# Altium footprint library PCB_CONNECTORS.PcbLib: 676 footprints (part 19 of 43)
Each footprint in its own frame and in the unit in brackets; x right, y up, seen from the top. Pads: shape width x height; smd on the part's side, far side on the other; paste and mask are expansions set on the pad; w line width, h text height; cw(c..) or ccw(c..) is an arc to the next point about the centre after c.
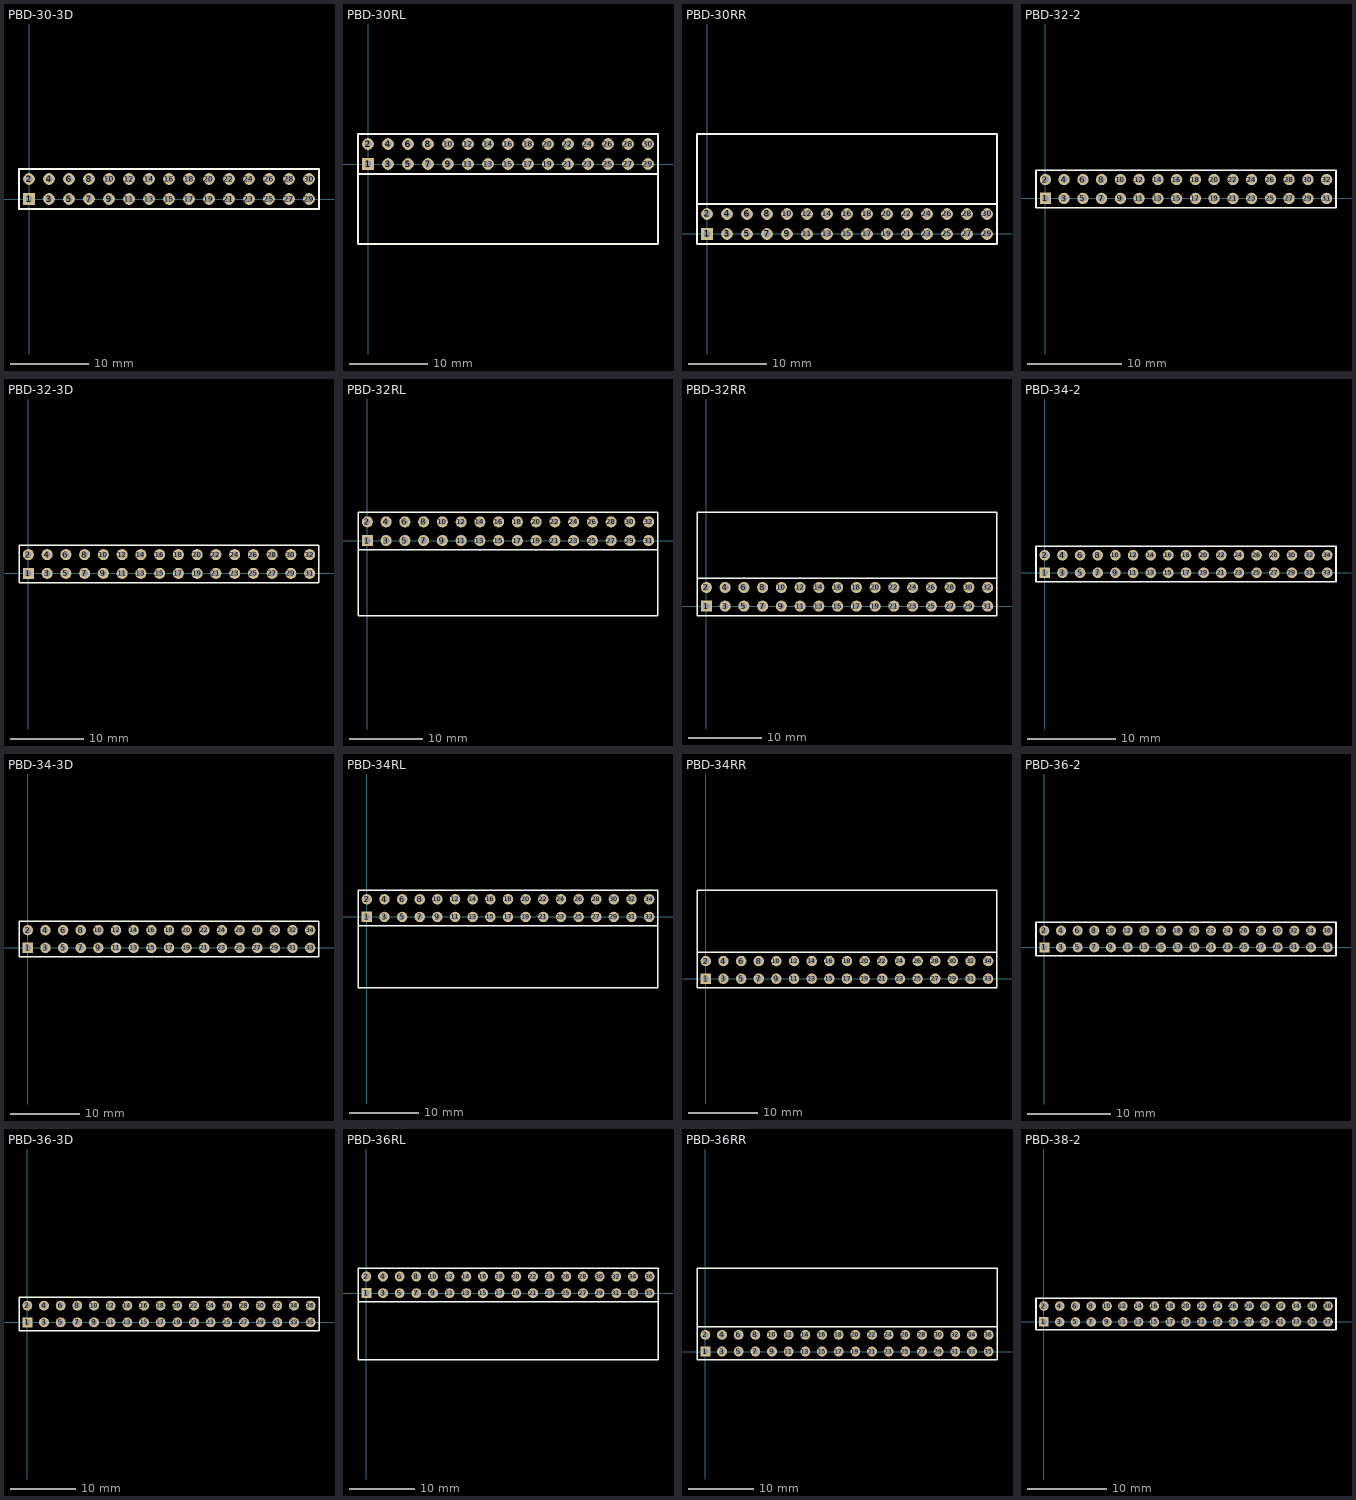
[diagram p18: the footprints below, top view; thin cyan lines are the x and y axes]

## PBD-30-3D [mm] "Connector; Header; 15x2 Position"
height 8
pads (30):
  rect 1.5x1.5 hole 0.9: 1(0,0)
  round 1.5 hole 0.9: 2(0,2.54) 3(2.54,0) 4(2.54,2.54) 5(5.08,0) 6(5.08,2.54) 7(7.62,0) 8(7.62,2.54) 9(10.16,0) 10(10.16,2.54) 11(12.7,0) 12(12.7,2.54) 13(15.24,0) 14(15.24,2.54) 15(17.78,0) 16(17.78,2.54) 17(20.32,0) 18(20.32,2.54) 19(22.86,0) 20(22.86,2.54) 21(25.4,0) 22(25.4,2.54) 23(27.94,0) 24(27.94,2.54) 25(30.48,0) 26(30.48,2.54) 27(33.02,0) 28(33.02,2.54) 29(35.56,0) 30(35.56,2.54)
Top Overlay:
  lines w0.2: -1.27,-1.27 36.83,-1.27 36.83,3.81 -1.27,3.81 -1.27,-1.27
3D body "PBD-2.stp": height 8.5, standoff -3.15, extent 31.75,-1.27 34.29,3.81
3D body "PBD-2.stp": height 8.5, standoff -3.15, extent 29.21,-1.27 31.75,3.81
3D body "PBD-2.stp": height 8.5, standoff -3.15, extent 34.29,-1.27 36.83,3.81
3D body "PBD-2.stp": height 8.5, standoff -3.15, extent 24.13,-1.27 26.67,3.81
3D body "PBD-2.stp": height 8.5, standoff -3.15, extent 21.59,-1.27 24.13,3.81
3D body "PBD-2.stp": height 8.5, standoff -3.15, extent 26.67,-1.27 29.21,3.81
3D body "PBD-2.stp": height 8.5, standoff -3.15, extent 16.51,-1.27 19.05,3.81
3D body "PBD-2.stp": height 8.5, standoff -3.15, extent 13.97,-1.27 16.51,3.81
3D body "PBD-2.stp": height 8.5, standoff -3.15, extent 19.05,-1.27 21.59,3.81
3D body "PBD-2.stp": height 8.5, standoff -3.15, extent 8.89,-1.27 11.43,3.81
3D body "PBD-2.stp": height 8.5, standoff -3.15, extent 6.35,-1.27 8.89,3.81
3D body "PBD-2.stp": height 8.5, standoff -3.15, extent 11.43,-1.27 13.97,3.81
3D body "PBD-2.stp": height 8.5, standoff -3.15, extent 1.27,-1.27 3.81,3.81
3D body "PBD-2.stp": height 8.5, standoff -3.15, extent -1.27,-1.27 1.27,3.81
3D body "PBD-2.stp": height 8.5, standoff -3.15, extent 3.81,-1.27 6.35,3.81

## PBD-30RL [mm] "Connector; Header; 15x2 Position"
height 5
pads (30):
  rect 1.5x1.5 hole 0.9: 1(0,0)
  round 1.5 hole 0.9: 2(0,2.54) 3(2.54,0) 4(2.54,2.54) 5(5.08,0) 6(5.08,2.54) 7(7.62,0) 8(7.62,2.54) 9(10.16,0) 10(10.16,2.54) 11(12.7,0) 12(12.7,2.54) 13(15.24,0) 14(15.24,2.54) 15(17.78,0) 16(17.78,2.54) 17(20.32,0) 18(20.32,2.54) 19(22.86,0) 20(22.86,2.54) 21(25.4,0) 22(25.4,2.54) 23(27.94,0) 24(27.94,2.54) 25(30.48,0) 26(30.48,2.54) 27(33.02,0) 28(33.02,2.54) 29(35.56,0) 30(35.56,2.54)
Top Overlay:
  lines w0.2: -1.27,-1.27 -1.27,-10.16 36.83,-10.16 36.83,-1.27 ; -1.27,-1.27 36.83,-1.27 ; -1.27,-1.27 -1.27,3.81 36.83,3.81 36.83,-1.27
3D body "PBD-30R.step": height 5, standoff -3, extent -1.27,-10.16 36.83,2.84

## PBD-30RR [mm] "Connector; Header; 15x2 Position"
height 5
pads (30):
  rect 1.5x1.5 hole 0.9: 1(0,0)
  round 1.5 hole 0.9: 2(0,2.54) 3(2.54,0) 4(2.54,2.54) 5(5.08,0) 6(5.08,2.54) 7(7.62,0) 8(7.62,2.54) 9(10.16,0) 10(10.16,2.54) 11(12.7,0) 12(12.7,2.54) 13(15.24,0) 14(15.24,2.54) 15(17.78,0) 16(17.78,2.54) 17(20.32,0) 18(20.32,2.54) 19(22.86,0) 20(22.86,2.54) 21(25.4,0) 22(25.4,2.54) 23(27.94,0) 24(27.94,2.54) 25(30.48,0) 26(30.48,2.54) 27(33.02,0) 28(33.02,2.54) 29(35.56,0) 30(35.56,2.54)
Top Overlay:
  lines w0.2: -1.27,3.81 -1.27,12.7 36.83,12.7 36.83,3.81 ; -1.27,3.81 36.83,3.81 ; -1.27,3.81 -1.27,-1.27 36.83,-1.27 36.83,3.81
3D body "PBD-30R.step": height 5, standoff -3, extent -1.27,-0.3 36.83,12.7

## PBD-32-2 [mm] "Connector; Header; 16x2 Position"
height 4.5
pads (32):
  rect 1.2x1.2 hole 0.75: 1(0,0)
  round 1.2 hole 0.75: 2(0,2) 3(2,0) 4(2,2) 5(4,0) 6(4,2) 7(6,0) 8(6,2) 9(8,0) 10(8,2) 11(10,0) 12(10,2) 13(12,0) 14(12,2) 15(14,0) 16(14,2) 17(16,0) 18(16,2) 19(18,0) 20(18,2) 21(20,0) 22(20,2) 23(22,0) 24(22,2) 25(24,0) 26(24,2) 27(26,0) 28(26,2) 29(28,0) 30(28,2) 31(30,0) 32(30,2)
Top Overlay:
  lines w0.2: -1,-1 31,-1 31,3 -1,3 -1,-1
3D body "PBD2mm.stp": height 4.5, standoff -2.7, extent 29,-1 31,3
3D body "PBD2mm.stp": height 4.5, standoff -2.7, extent 27,-1 29,3
3D body "PBD2mm.stp": height 4.5, standoff -2.7, extent 25,-1 27,3
3D body "PBD2mm.stp": height 4.5, standoff -2.7, extent 23,-1 25,3
3D body "PBD2mm.stp": height 4.5, standoff -2.7, extent 21,-1 23,3
3D body "PBD2mm.stp": height 4.5, standoff -2.7, extent 19,-1 21,3
3D body "PBD2mm.stp": height 4.5, standoff -2.7, extent 17,-1 19,3
3D body "PBD2mm.stp": height 4.5, standoff -2.7, extent 15,-1 17,3
3D body "PBD2mm.stp": height 4.5, standoff -2.7, extent 13,-1 15,3
3D body "PBD2mm.stp": height 4.5, standoff -2.7, extent 11,-1 13,3
3D body "PBD2mm.stp": height 4.5, standoff -2.7, extent 9,-1 11,3
3D body "PBD2mm.stp": height 4.5, standoff -2.7, extent 7,-1 9,3
3D body "PBD2mm.stp": height 4.5, standoff -2.7, extent 5,-1 7,3
3D body "PBD2mm.stp": height 4.5, standoff -2.7, extent 3,-1 5,3
3D body "PBD2mm.stp": height 4.5, standoff -2.7, extent 1,-1 3,3
3D body "PBD2mm.stp": height 4.5, standoff -2.7, extent -1,-1 1,3

## PBD-32-3D [mm] "Connector; Header; 16x2 Position"
height 8
pads (32):
  rect 1.5x1.5 hole 0.9: 1(0,0)
  round 1.5 hole 0.9: 2(0,2.54) 3(2.54,0) 4(2.54,2.54) 5(5.08,0) 6(5.08,2.54) 7(7.62,0) 8(7.62,2.54) 9(10.16,0) 10(10.16,2.54) 11(12.7,0) 12(12.7,2.54) 13(15.24,0) 14(15.24,2.54) 15(17.78,0) 16(17.78,2.54) 17(20.32,0) 18(20.32,2.54) 19(22.86,0) 20(22.86,2.54) 21(25.4,0) 22(25.4,2.54) 23(27.94,0) 24(27.94,2.54) 25(30.48,0) 26(30.48,2.54) 27(33.02,0) 28(33.02,2.54) 29(35.56,0) 30(35.56,2.54) 31(38.1,0) 32(38.1,2.54)
Top Overlay:
  lines w0.2: -1.27,-1.27 39.37,-1.27 39.37,3.81 -1.27,3.81 -1.27,-1.27
3D body "PBD-2.stp": height 8.5, standoff -3.15, extent 31.75,-1.27 34.29,3.81
3D body "PBD-2.stp": height 8.5, standoff -3.15, extent 29.21,-1.27 31.75,3.81
3D body "PBD-2.stp": height 8.5, standoff -3.15, extent 34.29,-1.27 36.83,3.81
3D body "PBD-2.stp": height 8.5, standoff -3.15, extent 24.13,-1.27 26.67,3.81
3D body "PBD-2.stp": height 8.5, standoff -3.15, extent 21.59,-1.27 24.13,3.81
3D body "PBD-2.stp": height 8.5, standoff -3.15, extent 26.67,-1.27 29.21,3.81
3D body "PBD-2.stp": height 8.5, standoff -3.15, extent 16.51,-1.27 19.05,3.81
3D body "PBD-2.stp": height 8.5, standoff -3.15, extent 13.97,-1.27 16.51,3.81
3D body "PBD-2.stp": height 8.5, standoff -3.15, extent 19.05,-1.27 21.59,3.81
3D body "PBD-2.stp": height 8.5, standoff -3.15, extent 8.89,-1.27 11.43,3.81
3D body "PBD-2.stp": height 8.5, standoff -3.15, extent 6.35,-1.27 8.89,3.81
3D body "PBD-2.stp": height 8.5, standoff -3.15, extent 11.43,-1.27 13.97,3.81
3D body "PBD-2.stp": height 8.5, standoff -3.15, extent 1.27,-1.27 3.81,3.81
3D body "PBD-2.stp": height 8.5, standoff -3.15, extent -1.27,-1.27 1.27,3.81
3D body "PBD-2.stp": height 8.5, standoff -3.15, extent 3.81,-1.27 6.35,3.81
3D body "PBD-2.stp": height 8.5, standoff -3.15, extent 36.83,-1.27 39.37,3.81

## PBD-32RL [mm] "Connector; Header; 16x2 Position"
height 5
pads (32):
  rect 1.5x1.5 hole 0.9: 1(0,0)
  round 1.5 hole 0.9: 2(0,2.54) 3(2.54,0) 4(2.54,2.54) 5(5.08,0) 6(5.08,2.54) 7(7.62,0) 8(7.62,2.54) 9(10.16,0) 10(10.16,2.54) 11(12.7,0) 12(12.7,2.54) 13(15.24,0) 14(15.24,2.54) 15(17.78,0) 16(17.78,2.54) 17(20.32,0) 18(20.32,2.54) 19(22.86,0) 20(22.86,2.54) 21(25.4,0) 22(25.4,2.54) 23(27.94,0) 24(27.94,2.54) 25(30.48,0) 26(30.48,2.54) 27(33.02,0) 28(33.02,2.54) 29(35.56,0) 30(35.56,2.54) 31(38.1,0) 32(38.1,2.54)
Top Overlay:
  lines w0.2: -1.27,-1.27 -1.27,-10.16 39.37,-10.16 39.37,-1.27 ; -1.27,-1.27 39.37,-1.27 ; -1.27,-1.27 -1.27,3.81 39.37,3.81 39.37,-1.27
3D body "PBD-32R.step": height 5, standoff -3, extent -1.27,-10.16 39.37,2.84

## PBD-32RR [mm] "Connector; Header; 16x2 Position"
height 5
pads (32):
  rect 1.5x1.5 hole 0.9: 1(0,0)
  round 1.5 hole 0.9: 2(0,2.54) 3(2.54,0) 4(2.54,2.54) 5(5.08,0) 6(5.08,2.54) 7(7.62,0) 8(7.62,2.54) 9(10.16,0) 10(10.16,2.54) 11(12.7,0) 12(12.7,2.54) 13(15.24,0) 14(15.24,2.54) 15(17.78,0) 16(17.78,2.54) 17(20.32,0) 18(20.32,2.54) 19(22.86,0) 20(22.86,2.54) 21(25.4,0) 22(25.4,2.54) 23(27.94,0) 24(27.94,2.54) 25(30.48,0) 26(30.48,2.54) 27(33.02,0) 28(33.02,2.54) 29(35.56,0) 30(35.56,2.54) 31(38.1,0) 32(38.1,2.54)
Top Overlay:
  lines w0.2: -1.27,3.81 -1.27,12.7 39.37,12.7 39.37,3.81 ; -1.27,3.81 39.37,3.81 ; -1.27,3.81 -1.27,-1.27 39.37,-1.27 39.37,3.81
3D body "PBD-32R.step": height 5, standoff -3, extent -1.27,-0.3 39.37,12.7

## PBD-34-2 [mm] "Connector; Header; 17x2 Position"
height 4.5
pads (34):
  rect 1.2x1.2 hole 0.75: 1(0,0)
  round 1.2 hole 0.75: 2(0,2) 3(2,0) 4(2,2) 5(4,0) 6(4,2) 7(6,0) 8(6,2) 9(8,0) 10(8,2) 11(10,0) 12(10,2) 13(12,0) 14(12,2) 15(14,0) 16(14,2) 17(16,0) 18(16,2) 19(18,0) 20(18,2) 21(20,0) 22(20,2) 23(22,0) 24(22,2) 25(24,0) 26(24,2) 27(26,0) 28(26,2) 29(28,0) 30(28,2) 31(30,0) 32(30,2) 33(32,0) 34(32,2)
Top Overlay:
  lines w0.2: -1,-1 33,-1 33,3 -1,3 -1,-1
3D body "PBD2mm.stp": height 4.5, standoff -2.7, extent 31,-1 33,3
3D body "PBD2mm.stp": height 4.5, standoff -2.7, extent 29,-1 31,3
3D body "PBD2mm.stp": height 4.5, standoff -2.7, extent 27,-1 29,3
3D body "PBD2mm.stp": height 4.5, standoff -2.7, extent 25,-1 27,3
3D body "PBD2mm.stp": height 4.5, standoff -2.7, extent 23,-1 25,3
3D body "PBD2mm.stp": height 4.5, standoff -2.7, extent 21,-1 23,3
3D body "PBD2mm.stp": height 4.5, standoff -2.7, extent 19,-1 21,3
3D body "PBD2mm.stp": height 4.5, standoff -2.7, extent 17,-1 19,3
3D body "PBD2mm.stp": height 4.5, standoff -2.7, extent 15,-1 17,3
3D body "PBD2mm.stp": height 4.5, standoff -2.7, extent 13,-1 15,3
3D body "PBD2mm.stp": height 4.5, standoff -2.7, extent 11,-1 13,3
3D body "PBD2mm.stp": height 4.5, standoff -2.7, extent 9,-1 11,3
3D body "PBD2mm.stp": height 4.5, standoff -2.7, extent 7,-1 9,3
3D body "PBD2mm.stp": height 4.5, standoff -2.7, extent 5,-1 7,3
3D body "PBD2mm.stp": height 4.5, standoff -2.7, extent 3,-1 5,3
3D body "PBD2mm.stp": height 4.5, standoff -2.7, extent 1,-1 3,3
3D body "PBD2mm.stp": height 4.5, standoff -2.7, extent -1,-1 1,3

## PBD-34-3D [mm] "Connector; Header; 17x2 Position"
height 8
pads (34):
  rect 1.5x1.5 hole 0.9: 1(0,0)
  round 1.5 hole 0.9: 2(0,2.54) 3(2.54,0) 4(2.54,2.54) 5(5.08,0) 6(5.08,2.54) 7(7.62,0) 8(7.62,2.54) 9(10.16,0) 10(10.16,2.54) 11(12.7,0) 12(12.7,2.54) 13(15.24,0) 14(15.24,2.54) 15(17.78,0) 16(17.78,2.54) 17(20.32,0) 18(20.32,2.54) 19(22.86,0) 20(22.86,2.54) 21(25.4,0) 22(25.4,2.54) 23(27.94,0) 24(27.94,2.54) 25(30.48,0) 26(30.48,2.54) 27(33.02,0) 28(33.02,2.54) 29(35.56,0) 30(35.56,2.54) 31(38.1,0) 32(38.1,2.54) 33(40.64,0) 34(40.64,2.54)
Top Overlay:
  lines w0.2: -1.27,-1.27 41.91,-1.27 41.91,3.81 -1.27,3.81 -1.27,-1.27
3D body "PBD-2.stp": height 8.5, standoff -3.15, extent 39.37,-1.27 41.91,3.81
3D body "PBD-2.stp": height 8.5, standoff -3.15, extent 36.83,-1.27 39.37,3.81
3D body "PBD-2.stp": height 8.5, standoff -3.15, extent 3.81,-1.27 6.35,3.81
3D body "PBD-2.stp": height 8.5, standoff -3.15, extent -1.27,-1.27 1.27,3.81
3D body "PBD-2.stp": height 8.5, standoff -3.15, extent 1.27,-1.27 3.81,3.81
3D body "PBD-2.stp": height 8.5, standoff -3.15, extent 11.43,-1.27 13.97,3.81
3D body "PBD-2.stp": height 8.5, standoff -3.15, extent 6.35,-1.27 8.89,3.81
3D body "PBD-2.stp": height 8.5, standoff -3.15, extent 8.89,-1.27 11.43,3.81
3D body "PBD-2.stp": height 8.5, standoff -3.15, extent 19.05,-1.27 21.59,3.81
3D body "PBD-2.stp": height 8.5, standoff -3.15, extent 13.97,-1.27 16.51,3.81
3D body "PBD-2.stp": height 8.5, standoff -3.15, extent 16.51,-1.27 19.05,3.81
3D body "PBD-2.stp": height 8.5, standoff -3.15, extent 26.67,-1.27 29.21,3.81
3D body "PBD-2.stp": height 8.5, standoff -3.15, extent 21.59,-1.27 24.13,3.81
3D body "PBD-2.stp": height 8.5, standoff -3.15, extent 24.13,-1.27 26.67,3.81
3D body "PBD-2.stp": height 8.5, standoff -3.15, extent 34.29,-1.27 36.83,3.81
3D body "PBD-2.stp": height 8.5, standoff -3.15, extent 29.21,-1.27 31.75,3.81
3D body "PBD-2.stp": height 8.5, standoff -3.15, extent 31.75,-1.27 34.29,3.81

## PBD-34RL [mm] "Connector; Header; 17x2 Position"
height 5
pads (34):
  rect 1.5x1.5 hole 0.9: 1(0,0)
  round 1.5 hole 0.9: 2(0,2.54) 3(2.54,0) 4(2.54,2.54) 5(5.08,0) 6(5.08,2.54) 7(7.62,0) 8(7.62,2.54) 9(10.16,0) 10(10.16,2.54) 11(12.7,0) 12(12.7,2.54) 13(15.24,0) 14(15.24,2.54) 15(17.78,0) 16(17.78,2.54) 17(20.32,0) 18(20.32,2.54) 19(22.86,0) 20(22.86,2.54) 21(25.4,0) 22(25.4,2.54) 23(27.94,0) 24(27.94,2.54) 25(30.48,0) 26(30.48,2.54) 27(33.02,0) 28(33.02,2.54) 29(35.56,0) 30(35.56,2.54) 31(38.1,0) 32(38.1,2.54) 33(40.64,0) 34(40.64,2.54)
Top Overlay:
  lines w0.2: -1.27,-1.27 -1.27,-10.16 41.91,-10.16 41.91,-1.27 ; -1.27,-1.27 41.91,-1.27 ; -1.27,-1.27 -1.27,3.81 41.91,3.81 41.91,-1.27
3D body "PBD-34R.step": height 5, standoff -3, extent -1.27,-10.16 41.91,2.84

## PBD-34RR [mm] "Connector; Header; 17x2 Position"
height 5
pads (34):
  rect 1.5x1.5 hole 0.9: 1(0,0)
  round 1.5 hole 0.9: 2(0,2.54) 3(2.54,0) 4(2.54,2.54) 5(5.08,0) 6(5.08,2.54) 7(7.62,0) 8(7.62,2.54) 9(10.16,0) 10(10.16,2.54) 11(12.7,0) 12(12.7,2.54) 13(15.24,0) 14(15.24,2.54) 15(17.78,0) 16(17.78,2.54) 17(20.32,0) 18(20.32,2.54) 19(22.86,0) 20(22.86,2.54) 21(25.4,0) 22(25.4,2.54) 23(27.94,0) 24(27.94,2.54) 25(30.48,0) 26(30.48,2.54) 27(33.02,0) 28(33.02,2.54) 29(35.56,0) 30(35.56,2.54) 31(38.1,0) 32(38.1,2.54) 33(40.64,0) 34(40.64,2.54)
Top Overlay:
  lines w0.2: -1.27,3.81 -1.27,12.7 41.91,12.7 41.91,3.81 ; -1.27,3.81 41.91,3.81 ; -1.27,3.81 -1.27,-1.27 41.91,-1.27 41.91,3.81
3D body "PBD-34R.step": height 5, standoff -3, extent -1.27,-0.3 41.91,12.7

## PBD-36-2 [mm] "Connector; Header; 18x2 Position"
height 4.5
pads (36):
  rect 1.2x1.2 hole 0.75: 1(0,0)
  round 1.2 hole 0.75: 2(0,2) 3(2,0) 4(2,2) 5(4,0) 6(4,2) 7(6,0) 8(6,2) 9(8,0) 10(8,2) 11(10,0) 12(10,2) 13(12,0) 14(12,2) 15(14,0) 16(14,2) 17(16,0) 18(16,2) 19(18,0) 20(18,2) 21(20,0) 22(20,2) 23(22,0) 24(22,2) 25(24,0) 26(24,2) 27(26,0) 28(26,2) 29(28,0) 30(28,2) 31(30,0) 32(30,2) 33(32,0) 34(32,2) 35(34,0) 36(34,2)
Top Overlay:
  lines w0.2: -1,-1 35,-1 35,3 -1,3 -1,-1
3D body "PBD2mm.stp": height 4.5, standoff -2.7, extent 33,-1 35,3
3D body "PBD2mm.stp": height 4.5, standoff -2.7, extent 31,-1 33,3
3D body "PBD2mm.stp": height 4.5, standoff -2.7, extent 29,-1 31,3
3D body "PBD2mm.stp": height 4.5, standoff -2.7, extent 27,-1 29,3
3D body "PBD2mm.stp": height 4.5, standoff -2.7, extent 25,-1 27,3
3D body "PBD2mm.stp": height 4.5, standoff -2.7, extent 23,-1 25,3
3D body "PBD2mm.stp": height 4.5, standoff -2.7, extent 21,-1 23,3
3D body "PBD2mm.stp": height 4.5, standoff -2.7, extent 19,-1 21,3
3D body "PBD2mm.stp": height 4.5, standoff -2.7, extent 17,-1 19,3
3D body "PBD2mm.stp": height 4.5, standoff -2.7, extent 15,-1 17,3
3D body "PBD2mm.stp": height 4.5, standoff -2.7, extent 13,-1 15,3
3D body "PBD2mm.stp": height 4.5, standoff -2.7, extent 11,-1 13,3
3D body "PBD2mm.stp": height 4.5, standoff -2.7, extent 9,-1 11,3
3D body "PBD2mm.stp": height 4.5, standoff -2.7, extent 7,-1 9,3
3D body "PBD2mm.stp": height 4.5, standoff -2.7, extent 5,-1 7,3
3D body "PBD2mm.stp": height 4.5, standoff -2.7, extent 3,-1 5,3
3D body "PBD2mm.stp": height 4.5, standoff -2.7, extent 1,-1 3,3
3D body "PBD2mm.stp": height 4.5, standoff -2.7, extent -1,-1 1,3

## PBD-36-3D [mm] "Connector; Header; 18x2 Position"
height 8
pads (36):
  rect 1.5x1.5 hole 0.9: 1(0,0)
  round 1.5 hole 0.9: 2(0,2.54) 3(2.54,0) 4(2.54,2.54) 5(5.08,0) 6(5.08,2.54) 7(7.62,0) 8(7.62,2.54) 9(10.16,0) 10(10.16,2.54) 11(12.7,0) 12(12.7,2.54) 13(15.24,0) 14(15.24,2.54) 15(17.78,0) 16(17.78,2.54) 17(20.32,0) 18(20.32,2.54) 19(22.86,0) 20(22.86,2.54) 21(25.4,0) 22(25.4,2.54) 23(27.94,0) 24(27.94,2.54) 25(30.48,0) 26(30.48,2.54) 27(33.02,0) 28(33.02,2.54) 29(35.56,0) 30(35.56,2.54) 31(38.1,0) 32(38.1,2.54) 33(40.64,0) 34(40.64,2.54) 35(43.18,0) 36(43.18,2.54)
Top Overlay:
  lines w0.2: -1.27,-1.27 44.45,-1.27 44.45,3.81 -1.27,3.81 -1.27,-1.27
3D body "PBD-2.stp": height 8.5, standoff -3.15, extent 3.81,-1.27 6.35,3.81
3D body "PBD-2.stp": height 8.5, standoff -3.15, extent -1.27,-1.27 1.27,3.81
3D body "PBD-2.stp": height 8.5, standoff -3.15, extent 1.27,-1.27 3.81,3.81
3D body "PBD-2.stp": height 8.5, standoff -3.15, extent 11.43,-1.27 13.97,3.81
3D body "PBD-2.stp": height 8.5, standoff -3.15, extent 6.35,-1.27 8.89,3.81
3D body "PBD-2.stp": height 8.5, standoff -3.15, extent 8.89,-1.27 11.43,3.81
3D body "PBD-2.stp": height 8.5, standoff -3.15, extent 19.05,-1.27 21.59,3.81
3D body "PBD-2.stp": height 8.5, standoff -3.15, extent 13.97,-1.27 16.51,3.81
3D body "PBD-2.stp": height 8.5, standoff -3.15, extent 16.51,-1.27 19.05,3.81
3D body "PBD-2.stp": height 8.5, standoff -3.15, extent 26.67,-1.27 29.21,3.81
3D body "PBD-2.stp": height 8.5, standoff -3.15, extent 21.59,-1.27 24.13,3.81
3D body "PBD-2.stp": height 8.5, standoff -3.15, extent 24.13,-1.27 26.67,3.81
3D body "PBD-2.stp": height 8.5, standoff -3.15, extent 34.29,-1.27 36.83,3.81
3D body "PBD-2.stp": height 8.5, standoff -3.15, extent 29.21,-1.27 31.75,3.81
3D body "PBD-2.stp": height 8.5, standoff -3.15, extent 31.75,-1.27 34.29,3.81
3D body "PBD-2.stp": height 8.5, standoff -3.15, extent 41.91,-1.27 44.45,3.81
3D body "PBD-2.stp": height 8.5, standoff -3.15, extent 36.83,-1.27 39.37,3.81
3D body "PBD-2.stp": height 8.5, standoff -3.15, extent 39.37,-1.27 41.91,3.81

## PBD-36RL [mm] "Connector; Header; 18x2 Position"
height 5
pads (36):
  rect 1.5x1.5 hole 0.9: 1(0,0)
  round 1.5 hole 0.9: 2(0,2.54) 3(2.54,0) 4(2.54,2.54) 5(5.08,0) 6(5.08,2.54) 7(7.62,0) 8(7.62,2.54) 9(10.16,0) 10(10.16,2.54) 11(12.7,0) 12(12.7,2.54) 13(15.24,0) 14(15.24,2.54) 15(17.78,0) 16(17.78,2.54) 17(20.32,0) 18(20.32,2.54) 19(22.86,0) 20(22.86,2.54) 21(25.4,0) 22(25.4,2.54) 23(27.94,0) 24(27.94,2.54) 25(30.48,0) 26(30.48,2.54) 27(33.02,0) 28(33.02,2.54) 29(35.56,0) 30(35.56,2.54) 31(38.1,0) 32(38.1,2.54) 33(40.64,0) 34(40.64,2.54) 35(43.18,0) 36(43.18,2.54)
Top Overlay:
  lines w0.2: -1.27,-1.27 -1.27,-10.16 44.45,-10.16 44.45,-1.27 ; -1.27,-1.27 44.45,-1.27 ; -1.27,-1.27 -1.27,3.81 44.45,3.81 44.45,-1.27
3D body "PBD-36R.step": height 5, standoff -3, extent -1.27,-10.16 44.45,2.84

## PBD-36RR [mm] "Connector; Header; 18x2 Position"
height 5
pads (36):
  rect 1.5x1.5 hole 0.9: 1(0,0)
  round 1.5 hole 0.9: 2(0,2.54) 3(2.54,0) 4(2.54,2.54) 5(5.08,0) 6(5.08,2.54) 7(7.62,0) 8(7.62,2.54) 9(10.16,0) 10(10.16,2.54) 11(12.7,0) 12(12.7,2.54) 13(15.24,0) 14(15.24,2.54) 15(17.78,0) 16(17.78,2.54) 17(20.32,0) 18(20.32,2.54) 19(22.86,0) 20(22.86,2.54) 21(25.4,0) 22(25.4,2.54) 23(27.94,0) 24(27.94,2.54) 25(30.48,0) 26(30.48,2.54) 27(33.02,0) 28(33.02,2.54) 29(35.56,0) 30(35.56,2.54) 31(38.1,0) 32(38.1,2.54) 33(40.64,0) 34(40.64,2.54) 35(43.18,0) 36(43.18,2.54)
Top Overlay:
  lines w0.2: -1.27,3.81 -1.27,12.7 44.45,12.7 44.45,3.81 ; -1.27,3.81 44.45,3.81 ; -1.27,3.81 -1.27,-1.27 44.45,-1.27 44.45,3.81
3D body "PBD-36R.step": height 5, standoff -3, extent -1.27,-0.3 44.45,12.7

## PBD-38-2 [mm] "Connector; Header; 19x2 Position"
height 4.5
pads (38):
  rect 1.2x1.2 hole 0.75: 1(0,0)
  round 1.2 hole 0.75: 2(0,2) 3(2,0) 4(2,2) 5(4,0) 6(4,2) 7(6,0) 8(6,2) 9(8,0) 10(8,2) 11(10,0) 12(10,2) 13(12,0) 14(12,2) 15(14,0) 16(14,2) 17(16,0) 18(16,2) 19(18,0) 20(18,2) 21(20,0) 22(20,2) 23(22,0) 24(22,2) 25(24,0) 26(24,2) 27(26,0) 28(26,2) 29(28,0) 30(28,2) 31(30,0) 32(30,2) 33(32,0) 34(32,2) 35(34,0) 36(34,2) 37(36,0) 38(36,2)
Top Overlay:
  lines w0.2: -1,-1 -1,3 37,3 37,-1 -1,-1
3D body "PBD2mm.stp": height 4.5, standoff -2.7, extent -1,-1 1,3
3D body "PBD2mm.stp": height 4.5, standoff -2.7, extent 1,-1 3,3
3D body "PBD2mm.stp": height 4.5, standoff -2.7, extent 3,-1 5,3
3D body "PBD2mm.stp": height 4.5, standoff -2.7, extent 5,-1 7,3
3D body "PBD2mm.stp": height 4.5, standoff -2.7, extent 7,-1 9,3
3D body "PBD2mm.stp": height 4.5, standoff -2.7, extent 9,-1 11,3
3D body "PBD2mm.stp": height 4.5, standoff -2.7, extent 11,-1 13,3
3D body "PBD2mm.stp": height 4.5, standoff -2.7, extent 13,-1 15,3
3D body "PBD2mm.stp": height 4.5, standoff -2.7, extent 15,-1 17,3
3D body "PBD2mm.stp": height 4.5, standoff -2.7, extent 17,-1 19,3
3D body "PBD2mm.stp": height 4.5, standoff -2.7, extent 19,-1 21,3
3D body "PBD2mm.stp": height 4.5, standoff -2.7, extent 21,-1 23,3
3D body "PBD2mm.stp": height 4.5, standoff -2.7, extent 23,-1 25,3
3D body "PBD2mm.stp": height 4.5, standoff -2.7, extent 25,-1 27,3
3D body "PBD2mm.stp": height 4.5, standoff -2.7, extent 27,-1 29,3
3D body "PBD2mm.stp": height 4.5, standoff -2.7, extent 29,-1 31,3
3D body "PBD2mm.stp": height 4.5, standoff -2.7, extent 31,-1 33,3
3D body "PBD2mm.stp": height 4.5, standoff -2.7, extent 33,-1 35,3
3D body "PBD2mm.stp": height 4.5, standoff -2.7, extent 35,-1 37,3